# Altium footprint library ic.PcbLib: 129 footprints (part 3 of 9)
Each footprint in its own frame and in the unit in brackets; x right, y up, seen from the top. Pads: shape width x height; smd on the part's side, far side on the other; paste and mask are expansions set on the pad; w line width, h text height; cw(c..) or ccw(c..) is an arc to the next point about the centre after c.
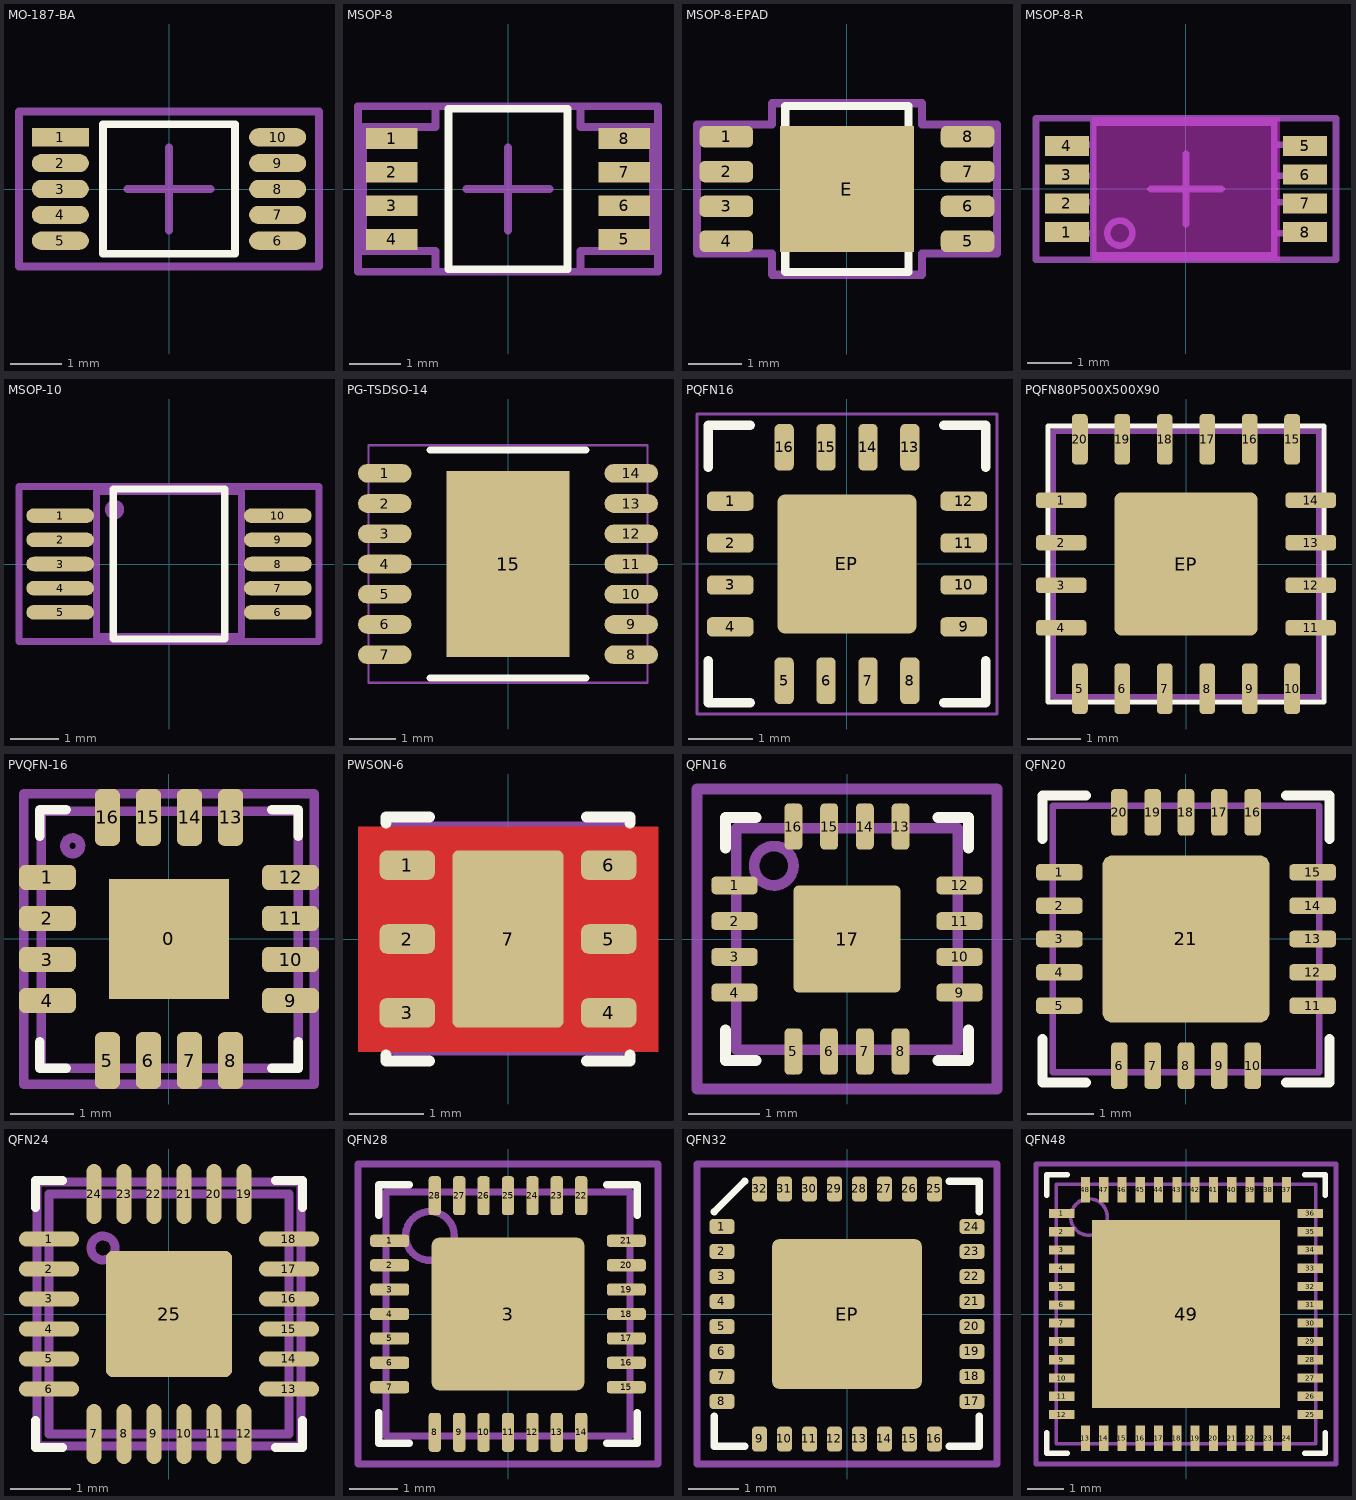
[diagram p2: the footprints below, top view; thin cyan lines are the x and y axes]

## MO-187-BA [mm]
pads (10):
  rect 1.1x0.35 smd: 1(-2.1,1)
  oval 1.1x0.35 smd: 2(-2.1,0.5) 3(-2.1,0) 4(-2.1,-0.5) 5(-2.1,-1) 6(2.1,-1) 7(2.1,-0.5) 8(2.1,0) 9(2.1,0.5) 10(2.1,1)
Top Overlay:
  lines w0.15: 0.075,1.25 1.275,1.25 1.275,-1.25 -1.275,-1.25 -1.275,1.25 0.084,1.25
  text "." at -2.425,1.625 h0.1
Top Courtyard:
  lines w0.15: -0.8,0 0,0 ; 0,-0.8 0,0 ; 0,0.8 0,0 ; 0.8,0 0,0 ; -2.9,-1.5 -2.9,1.5 2.9,1.5 2.9,-1.5 -2.9,-1.5
3D body "MSOP-10.STEP": height 1.05, standoff 0, extent -2.539,-1.5 2.489,1.5

## MSOP-8 [mm]
height 1.1
pads (8):
  rect 1x0.4 smd: 1(-2.25,0.975) 2(-2.25,0.325) 3(-2.25,-0.325) 4(-2.25,-0.975) 5(2.25,-0.975) 6(2.25,-0.325) 7(2.25,0.325) 8(2.25,0.975)
Top Overlay:
  lines w0.15: -1.15,-1.55 1.15,-1.55 1.15,1.55 -1.15,1.55 -1.15,-1.55
  text "." at -2.675,1.625 h0.1
Top Courtyard:
  lines w0.15: -0.8,0 0,0 ; 0,-0.8 0,0 ; 0,0.8 0,0 ; 0.8,0 0,0 ; -2.9,-1.6 2.9,-1.6 2.9,1.6 -2.9,1.6 -2.9,-1.6 ; -2.797,-1.2 -1.4,-1.2 -1.4,-1.6 0,-1.6 1.4,-1.6 1.4,-1.2 2.8,-1.2 2.8,-0.3 2.8,1.2 1.4,1.2 1.4,1.6 0,1.6 -1.4,1.6 -1.4,1.2 -2.797,1.2 -2.797,-0.303 -2.797,-0.4 -2.797,-1.2
3D body "MSOP-8.STEP": height 1, standoff -0.07, extent -2.51,-1.5 2.51,1.5

## MSOP-8-EPAD [mm]
height 1.1
pads (9):
  rrect50% 1x0.4 smd: 1(-2.25,0.975) 2(-2.25,0.325) 3(-2.25,-0.325) 4(-2.25,-0.975) 5(2.25,-0.975) 6(2.25,-0.325) 7(2.25,0.325) 8(2.25,0.975)
  rect 2.5x2.35 smd: E(0,0)
Top Overlay:
  lines w0.15: -1.15,-1.55 1.15,-1.55 1.15,1.55 -1.15,1.55 -1.15,-1.55
  text "." at -2.675,1.625 h0.1
Top Courtyard:
  lines w0.15: -2.797,-1.2 -1.4,-1.2 -1.4,-1.6 0,-1.6 1.4,-1.6 1.4,-1.2 2.8,-1.2 2.8,-0.3 2.8,1.2 1.4,1.2 1.4,1.6 0,1.6 -1.4,1.6 -1.4,1.2 -2.797,1.2 -2.797,-0.303 -2.797,-0.4 -2.797,-1.2
3D body "MSOP-8.STEP": height 1, standoff -0.07, extent -2.51,-1.5 2.51,1.5

## MSOP-8-R [mm]
height 1.1
pads (8):
  rect 1x0.45 smd: 1(-2.7,-0.975) 2(-2.7,-0.325) 3(-2.7,0.325) 4(-2.7,0.975) 5(2.7,0.975) 6(2.7,0.325) 7(2.7,-0.325) 8(2.7,-0.975)
Top Overlay:
  text "." at -2.95,-1.625 h0.1
Keep-Out Layer:
  board cut-out: -2.125,1.625 2.125,1.625 2.125,-1.625 -2.125,-1.625
Top Courtyard:
  lines w0.15: -0.8,0 0,0 ; 0,-0.8 0,0 ; 0,0.8 0,0 ; 0.8,0 0,0 ; -3.4,-1.6 -3.4,1.6 3.4,1.6 3.4,-1.6 -3.4,-1.6
Mechanical 29:
  circle w0.15: c-1.5,-1 r0.283
  lines w0.15: -3,-1 -2.1,-1 ; -3,-0.3 -2.1,-0.3 ; -3,0.3 -2.1,0.3 ; -3,1 -2.1,1 ; 2,-1 2.9,-1 ; 2,-0.3 2.9,-0.3 ; 2,0.3 2.9,0.3 ; 2,1 2.9,1 ; -2.1,-1.5 -2.1,1.5 2,1.5 2,-1.5 -2.1,-1.5
  text ".Designator" at -2,-0.2 h1
3D body "MSOP-8.STEP": height 0.22, standoff -0.85, extent -2.51,-1.5 2.51,1.5

## MSOP-10 [mm]
height 1.1
pads (10):
  oval 1.4x0.3 smd: 1(-2.25,1) 2(-2.25,0.5) 3(-2.25,0) 4(-2.25,-0.5) 5(-2.25,-1) 6(2.25,-1) 7(2.25,-0.5) 8(2.25,0) 9(2.25,0.5) 10(2.25,1)
Top Overlay:
  lines w0.15: -1.15,-1.55 1.15,-1.55 1.15,1.55 -1.15,1.55 -1.15,-1.55
  text "." at -2.65,1.6 h0.1
Top Courtyard:
  lines w0.15: -3.1,-1.6 3.1,-1.6 3.1,1.6 -3.1,1.6 -3.1,-1.6
Mechanical 29:
  circle w0.15: c-1.125,1.125 r0.125
  lines w0.15: -1.5,-1.075 -1.5,-0.925 ; -1.5,-0.575 -1.5,-0.425 ; -1.5,-0.075 -1.5,0.075 ; -1.5,0.45 -1.5,0.6 ; -1.5,0.925 -1.5,1.075 ; 1.5,-1.075 1.5,-0.925 ; 1.5,-0.575 1.5,-0.425 ; 1.5,-0.075 1.5,0.075 ; 1.5,0.45 1.5,0.6 ; 1.5,0.925 1.5,1.075 ; -1.5,-1.5 -1.5,0 -1.5,1.5 0,1.5 1.5,1.5 1.5,0 1.5,-1.5 0,-1.5 -1.5,-1.5
  text ".Designator" at -1.3,-0.3 h1
3D body "MSOP-10.STEP": height 1.05, standoff 0, extent -2.514,-1.525 2.514,1.475

## PG-TSDSO-14 [mm] "TSOP, 14-Leads, Body 4,90x3,90mm, Pitch 0,65mm, Thermal Pad 4,00x2,65mm, IPC High Density"
height 1.15
pads (15):
  oval 1.15x0.4 smd: 1(-2.65,1.95) 2(-2.65,1.3) 3(-2.65,0.65) 4(-2.65,0) 5(-2.65,-0.65) 6(-2.65,-1.3) 7(-2.65,-1.95) 8(2.65,-1.95) 9(2.65,-1.3) 10(2.65,-0.65) 11(2.65,0) 12(2.65,0.65) 13(2.65,1.3) 14(2.65,1.95)
  rect 2.65x4 smd: 15(0,0)
Top Overlay:
  lines w0.15: -1.675,-2.45 1.675,-2.45 ; -1.675,2.45 1.675,2.45
  text "." at -2.695,2.657 h0.1
Top Courtyard:
  lines w0.05: -3,-2.55 3,-2.55 3,2.55 -3,2.55 -3,-2.55
3D body "PG-TSDSO-14.step": height 1.15, standoff 0, extent -3,-2.45 3,2.45

## PQFN16 [mm] "QFN, 16-Leads, Body 4,00x4,00mm, Pitch 0,65mm, Thermal Pad 2,15x2,15mm, IPC High Density"
height 0.75
pads (17):
  rrect50% 0.72x0.3 smd: 1(-1.81,0.975) 2(-1.81,0.325) 3(-1.81,-0.325) 4(-1.81,-0.975) 9(1.81,-0.975) 10(1.81,-0.325) 11(1.81,0.325) 12(1.81,0.975)
  rrect50% 0.3x0.72 smd: 5(-0.975,-1.81) 6(-0.325,-1.81) 7(0.325,-1.81) 8(0.975,-1.81) 13(0.975,1.81) 14(0.325,1.81) 15(-0.325,1.81) 16(-0.975,1.81)
  rrect10% 2.15x2.15 smd: EP(0,0)
Top Overlay:
  lines w0.15: -2.15,-1.5 -2.15,-2.15 -1.5,-2.15 ; -2.15,1.5 -2.15,2.15 -1.5,2.15 ; 1.5,-2.15 2.15,-2.15 2.15,-1.5 ; 1.5,2.15 2.15,2.15 2.15,1.5
  text "." at -2.7,2.2 h0.1
Top Courtyard:
  lines w0.05: -2.325,-2.325 -2.325,2.325 2.325,2.325 2.325,-2.325 -2.325,-2.325
3D body "PQFN16.step": height 0.75, standoff 0, extent -2.01,-2.01 2.01,2.01

## PQFN80P500X500X90 [mm] "PQFN, 20-Leads, Body 5,00x5,00mm, Pitch 0,80mm, Thermal Pad 2,70x2,70mm, IPC High Density"
height 0.9
pads (21):
  rrect50% 0.95x0.3 smd: 1(-2.35,1.2) 2(-2.35,0.4) 3(-2.35,-0.4) 4(-2.35,-1.2) 11(2.35,-1.2) 12(2.35,-0.4) 13(2.35,0.4) 14(2.35,1.2)
  rrect50% 0.3x0.95 smd: 5(-2,-2.35) 6(-1.2,-2.35) 7(-0.4,-2.35) 8(0.4,-2.35) 9(1.2,-2.35) 10(2,-2.35) 15(2,2.35) 16(1.2,2.35) 17(0.4,2.35) 18(-0.4,2.35) 19(-1.2,2.35) 20(-2,2.35)
  rrect10% 2.7x2.7 smd: EP(0,0)
Top Overlay:
  lines w0.1: -2.6,-2.6 0,-2.6 2.6,-2.6 2.6,0 2.6,2.6 0,2.6 -2.6,2.6 -2.6,0 -2.6,-2.6
  text "." at -3,1.7 h0.1
Top Courtyard:
  lines w0.05: -2.6,-2.6 -2.6,2.6 2.6,2.6 2.6,-2.6 -2.6,-2.6
Top Assembly:
  lines w0.1: -2.5,-2.5 -2.5,2.5 2.5,2.5 2.5,-2.5 -2.5,-2.5
3D body "PQFN80P500X500X90.step": height 0.9, standoff 0, extent -2.5,-2.5 2.5,2.5

## PVQFN-16 [mm]
height 1
pads (17):
  rect 1.9x1.9 smd: 0(0,0)
  rrect50% 0.9x0.4 smd: 1(-1.925,0.975) 2(-1.925,0.325) 3(-1.925,-0.325) 4(-1.925,-0.975) 9(1.925,-0.975) 10(1.925,-0.325) 11(1.925,0.325) 12(1.925,0.975)
  rrect50% 0.4x0.9 smd: 5(-0.975,-1.925) 6(-0.325,-1.925) 7(0.325,-1.925) 8(0.975,-1.925) 13(0.975,1.925) 14(0.325,1.925) 15(-0.325,1.925) 16(-0.975,1.925)
Top Overlay:
  lines w0.15: -2.05,-1.625 -2.05,-2.05 -1.625,-2.05 ; -2.05,1.625 -2.05,2.05 -1.625,2.05 ; 1.625,-2.05 2.05,-2.05 2.05,-1.625 ; 1.625,2.05 2.05,2.05 2.05,1.625
  text "." at -2.655,1.759 h0.1
Top Courtyard:
  lines w0.15: -2.3,-2.3 2.3,-2.3 2.3,2.3 -2.3,2.3 -2.3,-2.3
Mechanical 29:
  circle w0.15: c-1.525,1.475 r0.125
  lines w0.15: -2.025,-2.05 2.05,-2.05 2.05,2.025 -2.025,2.025 -2.025,-2.05
  text ".Designator" at -1.8,-0.4 h1

## PWSON-6 [mm] "SON, 6-Leads, Body 3,00x3,00mm, Pitch 1,00mm, Thermal Pad 2,40x1,50mm, IPC High Density"
height 0.8
pads (7):
  rrect50% 0.75x0.4 smd: 1(-1.365,1) 2(-1.365,0) 3(-1.365,-1) 4(1.365,-1) 5(1.365,0) 6(1.365,1)
  rrect10% 1.5x2.4 smd: 7(0,0)
Top Layer:
  pour cut-out: -2.032,1.524 2.032,1.524 2.032,-1.524 -2.032,-1.524
Top Overlay:
  lines w0.15: -1.65,-1.575 -1.65,-1.65 -1.065,-1.65 ; -1.65,1.575 -1.65,1.65 -1.065,1.65 ; 1.065,-1.65 1.65,-1.65 1.65,-1.575 ; 1.065,1.65 1.65,1.65 1.65,1.575
  text "." at -2.032,1.562 h0.1
Top Courtyard:
  lines w0.15: -1.524,-1.505 1.529,-1.505 1.529,1.517 -1.524,1.517 -1.524,-1.505
3D body "PWSON-6.step": height 0.8, standoff 0, extent -1.55,-1.5 1.55,1.5

## QFN16 [mm] "QFN, 16-Leads, Body 3x3mm, Pitch 0.5mm, Thermal Pad 2x2mm, IPC Medium Density"
height 0.9
pads (17):
  rrect50% 0.65x0.25 smd: 1(-1.575,0.75) 2(-1.575,0.25) 3(-1.575,-0.25) 4(-1.575,-0.75) 9(1.575,-0.75) 10(1.575,-0.25) 11(1.575,0.25) 12(1.575,0.75)
  rrect50% 0.25x0.65 smd: 5(-0.75,-1.575) 6(-0.25,-1.575) 7(0.25,-1.575) 8(0.75,-1.575) 13(0.75,1.575) 14(0.25,1.575) 15(-0.25,1.575) 16(-0.75,1.575)
  rrect10% 1.5x1.5 smd: 17(0,0)
Top Overlay:
  lines w0.15: -1.7,-1.275 -1.7,-1.7 -1.275,-1.7 ; -1.7,1.275 -1.7,1.7 -1.275,1.7 ; 1.275,-1.7 1.7,-1.7 1.7,-1.275 ; 1.275,1.7 1.7,1.7 1.7,1.275
  text "." at -2.5,1.338 h0.1
Top Courtyard:
  lines w0.15: -2.1,-2.1 2.1,-2.1 2.1,2.1 -2.1,2.1 -2.1,-2.1
Mechanical 29:
  circle w0.15: c-1.025,1.025 r0.275
  lines w0.15: -1.825,-0.75 -1.55,-0.75 ; -1.825,-0.25 -1.55,-0.25 ; -1.825,0.25 -1.55,0.25 ; -1.825,0.75 -1.55,0.75 ; -0.75,-1.825 -0.75,-1.55 ; -0.75,1.55 -0.75,1.825 ; -0.25,-1.825 -0.25,-1.55 ; -0.25,1.55 -0.25,1.825 ; 0.25,-1.825 0.25,-1.55 ; 0.25,1.55 0.25,1.825 ; 0.75,-1.825 0.75,-1.55 ; 0.75,1.55 0.75,1.825 ; 1.55,-0.75 1.825,-0.75 ; 1.55,-0.25 1.825,-0.25 ; 1.55,0.25 1.825,0.25 ; 1.55,0.75 1.825,0.75 ; -1.55,-1.55 1.55,-1.55 1.55,1.55 -1.55,1.55 -1.55,-1.55
  text ".Designator" at -1.5,-0.6 h1
3D body "QFN16.STEP": height 0.89, standoff 0, extent -1.55,-1.55 1.55,1.55

## QFN20 [mm] "QFN, 20-Leads, Body 4,00x4,00mm, Pitch 0,50mm, Thermal Pad 2,53x2,53mm, IPC Medium Density"
height 0.8
pads (21):
  rrect50% 0.7x0.25 smd: 1(-1.9,1) 2(-1.9,0.5) 3(-1.9,0) 4(-1.9,-0.5) 5(-1.9,-1) 11(1.9,-1) 12(1.9,-0.5) 13(1.9,0) 14(1.9,0.5) 15(1.9,1)
  rrect50% 0.25x0.7 smd: 6(-1,-1.9) 7(-0.5,-1.9) 8(0,-1.9) 9(0.5,-1.9) 10(1,-1.9) 16(1,1.9) 17(0.5,1.9) 18(0,1.9) 19(-0.5,1.9) 20(-1,1.9)
  rrect10% 2.5x2.5 smd: 21(0,0)
Top Overlay:
  lines w0.15: -2.15,-1.5 -2.15,-2.15 -1.5,-2.15 ; -2.15,1.5 -2.15,2.15 -1.5,2.15 ; 1.5,-2.15 2.15,-2.15 2.15,-1.5 ; 1.5,2.15 2.15,2.15 2.15,1.5
  text "." at -2.645,1.757 h0.1
Top Courtyard:
  lines w0.1: -2,-2 -2,2 2,2 2,-2 -2,-2
3D body "QFN20.step": height 0.8, standoff 0, extent -2.01,-2.01 2.01,2.01

## QFN24 [mm] "QFN, 24-Leads, Body 4x4mm, Pitch 0.5mm, Thermal Pad 2.1x2.1mm, IPC Low Density"
height 1
pads (25):
  oval 1x0.25 smd: 1(-2,1.25) 2(-2,0.75) 3(-2,0.25) 4(-2,-0.25) 5(-2,-0.75) 6(-2,-1.25) 13(2,-1.25) 14(2,-0.75) 15(2,-0.25) 16(2,0.25) 17(2,0.75) 18(2,1.25)
  oval 0.25x1 smd: 7(-1.25,-2) 8(-0.75,-2) 9(-0.25,-2) 10(0.25,-2) 11(0.75,-2) 12(1.25,-2) 19(1.25,2) 20(0.75,2) 21(0.25,2) 22(-0.25,2) 23(-0.75,2) 24(-1.25,2)
  rrect10% 2.1x2.1 smd: 25(0,0)
Top Overlay:
  lines w0.15: -2.225,-1.775 -2.225,-2.225 -1.775,-2.225 ; -2.225,1.775 -2.225,2.225 -1.775,2.225 ; 1.775,-2.225 2.225,-2.225 2.225,-1.775 ; 1.775,2.225 2.225,2.225 2.225,1.775
  text "." at -2.845,2.057 h0.1
Top Courtyard:
  lines w0.15: -2,-2 2,-2 2,2 -2,2 -2,-2
Mechanical 29:
  circle w0.15: c-1.1,1.1 r0.2
  lines w0.15: -2.2,-2.2 -2.2,2.2 2.2,2.2 2.2,-2.2 -2.2,-2.2
  text ".Designator" at -2,-0.4 h1
3D body "User Library-LFCSP-24.step": height 0.83, standoff -0.02, extent -2,-2 2,2

## QFN28 [mm] "QFN, 28-Leads, Body 5,00x5,00mm, Pitch 0,50mm, Thermal Pad, IPC Medium Density"
height 1
pads (29):
  rrect50% 0.8x0.25 smd: 1(-2.425,1.5) 2(-2.425,1) 3(-2.425,0.5) 4(-2.425,0) 5(-2.425,-0.5) 6(-2.425,-1) 7(-2.425,-1.5) 15(2.425,-1.5) 16(2.425,-1) 17(2.425,-0.5) 18(2.425,0) 19(2.425,0.5) 20(2.425,1) 21(2.425,1.5)
  rrect10% 3.13x3.13 smd: 3(0,0)
  rrect50% 0.25x0.8 smd: 8(-1.5,-2.425) 9(-1,-2.425) 10(-0.5,-2.425) 11(0,-2.425) 12(0.5,-2.425) 13(1,-2.425) 14(1.5,-2.425) 22(1.5,2.425) 23(1,2.425) 24(0.5,2.425) 25(0,2.425) 26(-0.5,2.425) 27(-1,2.425) 28(-1.5,2.425)
Top Overlay:
  lines w0.15: -2.65,-2.025 -2.65,-2.65 -2.025,-2.65 ; -2.65,2.025 -2.65,2.65 -2.025,2.65 ; 2.025,-2.65 2.65,-2.65 2.65,-2.025 ; 2.025,2.65 2.65,2.65 2.65,2.025
  text "." at -3.036,2.238 h0.1
Top Solder:
  rectangle: -1.3,1.1 -0.7,1.4
  rectangle: -1.3,0.6 -0.7,0.9
  rectangle: -1.3,0.1 -0.7,0.4
  rectangle: -1.3,-0.4 -0.7,-0.1
  rectangle: -1.3,-0.9 -0.7,-0.6
  rectangle: -1.3,-1.4 -0.7,-1.1
  rectangle: -0.3,-1.4 0.3,-1.1
  rectangle: -0.3,-0.9 0.3,-0.6
  rectangle: -0.3,-0.4 0.3,-0.1
  rectangle: -0.3,0.1 0.3,0.4
  rectangle: -0.3,0.6 0.3,0.9
  rectangle: -0.3,1.1 0.3,1.4
  rectangle: 0.7,-1.4 1.3,-1.1
  rectangle: 0.7,-0.9 1.3,-0.6
  rectangle: 0.7,-0.4 1.3,-0.1
  rectangle: 0.7,0.1 1.3,0.4
  rectangle: 0.7,0.6 1.3,0.9
  rectangle: 0.7,1.1 1.3,1.4
Top Courtyard:
  lines w0.15: -3.075,-3.075 3.075,-3.075 3.075,3.075 -3.075,3.075 -3.075,-3.075
Mechanical 29:
  circle w0.15: c-1.6,1.6 r0.5
  lines w0.15: -2.5,-2.5 -2.5,2.5 2.5,2.5 2.5,-2.5 -2.5,-2.5
  text ".Designator" at -2.2,-0.5 h1
3D body "QFN-28.step": height 1, standoff 0, extent -2.52,-2.52 2.52,2.52

## QFN32 [mm]
pads (33):
  rrect50% 0.5x0.3 smd: 1(-2.5,1.75) 2(-2.5,1.25) 3(-2.5,0.75) 4(-2.5,0.25) 5(-2.5,-0.25) 6(-2.5,-0.75) 7(-2.5,-1.25) 8(-2.5,-1.75) 17(2.5,-1.75) 18(2.5,-1.25) 19(2.5,-0.75) 20(2.5,-0.25) 21(2.5,0.25) 22(2.5,0.75) 23(2.5,1.25) 24(2.5,1.75)
  rrect50% 0.3x0.5 smd: 9(-1.75,-2.5) 10(-1.25,-2.5) 11(-0.75,-2.5) 12(-0.25,-2.5) 13(0.25,-2.5) 14(0.75,-2.5) 15(1.25,-2.5) 16(1.75,-2.5) 25(1.75,2.5) 26(1.25,2.5) 27(0.75,2.5) 28(0.25,2.5) 29(-0.25,2.5) 30(-0.75,2.5) 31(-1.25,2.5) 32(-1.75,2.5)
  rrect10% 3x3 smd: EP(0,0)
Top Overlay:
  lines w0.15: -2.65,-2.05 -2.65,-2.65 -2.05,-2.65 ; -2.65,2.05 -2.05,2.65 ; 2.05,-2.65 2.65,-2.65 2.65,-2.05 ; 2.05,2.65 2.65,2.65 2.65,2.05
  text "." at -2.675,2.65 h0.1
Top Courtyard:
  lines w0.15: -3,-3 -3,3 3,3 3,-3 -3,-3

## QFN48 [mm] "QFN, 48-Leads, Body 7,00x7,00mm, Pitch 0,50mm, Thermal Pad 5,15x5,15mm, IPC Medium Density"
height 0.75
pads (49):
  rect 0.7x0.25 smd: 1(-3.4,2.75) 2(-3.4,2.25) 3(-3.4,1.75) 4(-3.4,1.25) 5(-3.4,0.75) 6(-3.4,0.25) 7(-3.4,-0.25) 8(-3.4,-0.75) 9(-3.4,-1.25) 10(-3.4,-1.75) 11(-3.4,-2.25) 12(-3.4,-2.75) 25(3.4,-2.75) 26(3.4,-2.25) 27(3.4,-1.75) 28(3.4,-1.25) 29(3.4,-0.75) 30(3.4,-0.25) 31(3.4,0.25) 32(3.4,0.75) 33(3.4,1.25) 34(3.4,1.75) 35(3.4,2.25) 36(3.4,2.75)
  rect 0.25x0.7 smd: 13(-2.75,-3.4) 14(-2.25,-3.4) 15(-1.75,-3.4) 16(-1.25,-3.4) 17(-0.75,-3.4) 18(-0.25,-3.4) 19(0.25,-3.4) 20(0.75,-3.4) 21(1.25,-3.4) 22(1.75,-3.4) 23(2.25,-3.4) 24(2.75,-3.4) 37(2.75,3.4) 38(2.25,3.4) 39(1.75,3.4) 40(1.25,3.4) 41(0.75,3.4) 42(0.25,3.4) 43(-0.25,3.4) 44(-0.75,3.4) 45(-1.25,3.4) 46(-1.75,3.4) 47(-2.25,3.4) 48(-2.75,3.4)
  rect 5.15x5.15 smd: 49(0,0)
Top Overlay:
  lines w0.15: -3.8,-3.25 -3.8,-3.8 -3.25,-3.8 ; -3.8,3.25 -3.8,3.8 -3.25,3.8 ; 3.25,-3.8 3.8,-3.8 3.8,-3.25 ; 3.25,3.8 3.8,3.8 3.8,3.25
  text "." at -4.361,3.335 h0.1
Top Courtyard:
  lines w0.15: -0.5,0 0.5,0 ; 0,-0.5 0,0.5 ; -4.1,-4.1 4.1,-4.1 4.1,4.1 -4.1,4.1 -4.1,-4.1
Mechanical 13:
  circle w0.1: c-2.65,2.65 r0.5
  lines w0.1: -3.55,-3.55 3.55,-3.55 3.55,3.55 -3.55,3.55 -3.55,-3.55
3D body "QFN48.step": height 0.75, standoff 0, extent -3.6,-3.6 3.6,3.6